# Altium schematic symbol library lib_datalogger.SchLib: 1246 symbols (part 3 of 16) (continued)
## CMP-003-00018-2 (continued)
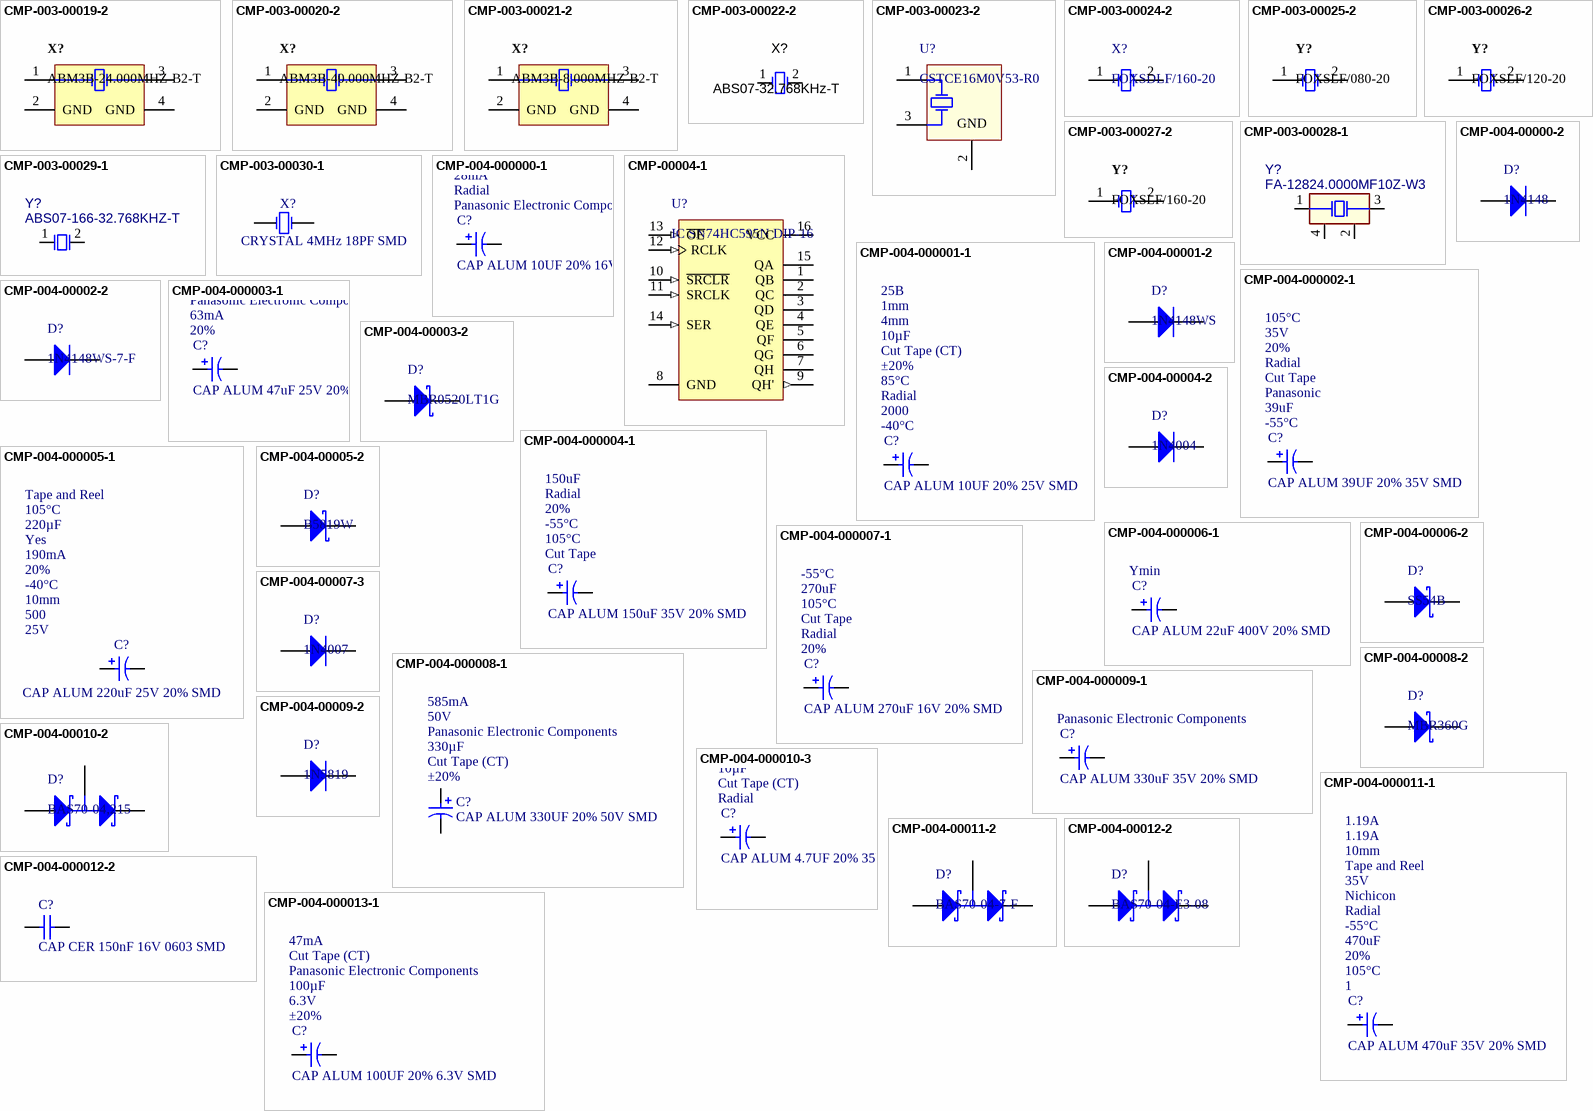
[diagram p7: symbols CMP-003-00019-2 to CMP-004-000013-1]

## CMP-003-00019-2
designator X?, comment ABM3B-24.000MHZ-B2-T
Ceramic SMD Crystal, 24 MHz, +/- 20 ppm, 18 pF, -20 to 70 degC, 4-Pin SMD, RoHS, Tape and Reel; Manufacturer: Abracon; Load Capacitance: 18pF; Frequency Tolerance: 20ppm; ESR: 50; Resistance: 50Ohm; Frequency: 24MHz; Package Quantity: 1000; Packaging: TapeandReel; RoHS Compliant: True; Package Description: 4-Pin Surface Mount Device, Body 5 x 3.2 mm; Mounting Technology: SM; Pins: 4; Datasheet URL: http://www.abracon.com/Resonators/abm3b.pdf; Tolerance: 20ppm; Manufacturer URL: http://www.abracon.com/; Max Operating Temperature: 70°C; Datasheet Version: Aug-15; Min Operating Temperature: -20°C; Package Reference: ABM3B; Case/Package: CSMD
footprint ABRA-ABM3B-4_V (SMD, 4-Leads, Body 5x3.2mm)
pins: 1 X1, 2 GND (power), 3 X2, 4 GND (power)

## CMP-003-00020-2
designator X?, comment ABM3B-40.000MHZ-B2-T
Ceramic SMD Crystal, 40 MHz, +/- 20 ppm, 18 pF, -20 to 70 degC, 4-Pin SMD, RoHS, Tape and Reel; Manufacturer: Abracon; Frequency: 40MHz; Tolerance: 20ppm; Load Capacitance: 18pF; ESR: 50; Case/Package: CSMD; RoHS Compliant: True; Package Quantity: 1000; Manufacturer URL: http://www.abracon.com/; Mounting Technology: SM; Min Operating Temperature: -20°C; Datasheet Version: Aug-15; Package Reference: ABM3B; Package Description: 4-Pin Surface Mount Device, Body 5 x 3.2 mm; Max Operating Temperature: 70°C; Packaging: TapeandReel; Frequency Tolerance: 20ppm; Datasheet URL: http://www.abracon.com/Resonators/abm3b.pdf
footprint ABRA-ABM3B-4_V (SMD, 4-Leads, Body 5x3.2mm)
pins: 1 X1, 2 GND (power), 3 X2, 4 GND (power)

## CMP-003-00021-2
designator X?, comment ABM3B-8.000MHZ-B2-T
Ceramic SMD Crystal, 8 MHz, +/- 20 ppm, 18 pF, -20 to 70 degC, 4-Pin SMD, RoHS, Tape and Reel; Manufacturer: Abracon; Resistance: 200Ohm; ESR: 200; Tolerance: 20ppm; Frequency: 8MHz; Load Capacitance: 18pF; Mounting Technology: SM; Case/Package: CSMD; Pins: 4; Datasheet Version: Aug-15; Datasheet URL: http://www.abracon.com/Resonators/abm3b.pdf; Manufacturer URL: http://www.abracon.com/; Package Quantity: 1000; Package Description: 4-Pin Surface Mount Device, Body 5 x 3.2 mm; Package Reference: ABM3B; Min Operating Temperature: -20°C; Max Operating Temperature: 70°C; Packaging: TapeandReel; Frequency Tolerance: 20ppm; RoHS Compliant: True
footprint ABRA-ABM3B_V (SMD, 4-Leads, Body 5x3.2mm)
pins: 1 X1, 2 GND (power), 3 X2, 4 GND (power)

## CMP-003-00022-2
designator X?, comment ABS07-32.768KHz-T
Low Profile Crystal, 32.768 kHz, +/- 20 ppm, 12.5 pF, -40 to 85 degC, 2-Pin SMD, Pb-Free, Tape and Reel; Manufacturer: Abracon; Frequency Tolerance: 20ppm; ESR: 70k; Load Capacitance: 12.5pF; Max Operating Temperature: 85°C; Mounting Technology: SM; Manufacturer URL: http://www.abracon.com/; Pins: 2; Packaging: TapeandReel; Tolerance: 20ppm; Min Operating Temperature: -40°C; Frequency: 32.768kHz; Datasheet URL: http://www.abracon.com/Resonators/ABS07.pdf; RoHS Compliant: True; Package Description: 2-Pin Surface Mount Device, Body 3.2 x 1.5 mm; Datasheet Version: Aug-15; Package Reference: ABS07-2; Package URL: http://www.abracon.com/Support/PackageDrawing/Resonators/ABS07.PDF; Package Quantity: 3000; Case/Package: CSMD
footprint ABRA-ABS07-2_V (SMD, 2-Leads, Body 3.2x1.5mm)
pins: 1 OSC1, 2 OSC2

## CMP-003-00023-2
designator U?, comment CSTCE16M0V53-R0
Ceramic Resonator, 16 MHz, +/- 0.5%, 15 pF, -20 to 80 degC, 3-Pin SMD, RoHS, Tape and Reel; Manufacturer: Murata; Frequency: 16MHz; Impedance: 40Ohm; Load Capacitance: 15pF; Min Operating Temperature: -20°C; Case/Package: CSMD; Frequency Tolerance: 0.5%; Max Operating Temperature: 80°C; Datasheet URL: http://www.murata.com/products/catalog/pdf/p16e.pdf; Manufacturer URL: http://www.murata.com/; Self Resonant Frequency: 16MHz; Tolerance: 0.5%; Package Reference: CSTCE_V-3; Package Quantity: 3000; Packaging: TapeandReel; Pins: 3; Datasheet Version: Rev. P16E, 12/2015; RoHS Compliant: True
footprint MURA-CSTCE_V-3_V (SMD, 3-Leads, Body 3.2x1.3mm, Pitch 0.95mm)
pins: 1 C1, 2 GND (power), 3 C2

## CMP-003-00024-2
designator X?, comment FOXSDLF/160-20
Resistance Weld SMD Crystal, 16 MHz, +/- 30 ppm, 20 pF, -20 to 70 degC, 2-Pin SMD, RoHS, Tape and Reel; Manufacturer: FOX Electronics; Load Capacitance: 20pF; Frequency Tolerance: 30ppm; Tolerance: 50ppm; Resistance: 40Ohm; Frequency: 16MHz; ESR: 40; Packaging: TapeandReel; Mounting Technology: SM; Package Description: 2-Pin Surface Mount Device, Body 5 x 11.7 mm, Height 4.5 mm; Pins: 2; Datasheet URL: http://foxonline.com/pdfs/hc49sdlf.pdf; Max Operating Temperature: 70°C; Package Reference: FOX-FOXSDLF160-20; Datasheet Version: Mar-15; Package Quantity: 1; Manufacturer URL: http://www.foxonline.com/; Case/Package: FOX-FOXSDLF160-20; Min Operating Temperature: -20°C; RoHS Compliant: True
footprint FOX-FOXSDLF160-20_V (SMD, 2-Leads, Body 5x11.7mm, Height 4.5mm)
pins: 1 X1, 2 X2

## CMP-003-00025-2
designator Y?, comment FOXSLF/080-20
Resistance Weld Thru-Hole Crystal, 8 MHz, +/- 50 ppm, 10 pF, -20 to 70 degC, 2-Pin THD, RoHS, Bulk; Manufacturer: FOX Electronics; Load Capacitance: 20pF; Frequency Tolerance: 30ppm; Tolerance: 50ppm; ESR: 80; Resistance: 80Ohm; Frequency: 8MHz; Packaging: Bulk; Datasheet Version: Mar-15; Manufacturer URL: http://www.foxonline.com/; Package Reference: FOXSLF080-20; Max Operating Temperature: 70°C; Package Quantity: 100; RoHS Compliant: True; Pins: 2; Mounting Technology: TH; Package Description: 2-Pin Through Hole Device, Body 11.35 x 4.65 mm; Datasheet URL: http://download.siliconexpert.com/pdfs/2015/4/5/6/5/7/200/fox_/manual/35607121449963728hc49slf.pdf; Min Operating Temperature: -20°C; Case/Package: FOXSLF080-20
footprint FOX-FOXSLF080-20 (THD, 2-Leads, Body 11.35x4.65mm)
pins: 1, 2

## CMP-003-00026-2
designator Y?, comment FOXSLF/120-20
Resistance Weld Thru-Hole Crystal, 12 MHz, +/-30 ppm, 20 pF, -20 to 70 degC, 2-Pin THD, RoHS, Bulk; Manufacturer: FOX Electronics; ESR: 60; Resistance: 60Ohm; Frequency Tolerance: 30ppm; Load Capacitance: 20pF; Frequency: 12MHz; Tolerance: 50ppm; Max Operating Temperature: 70°C; Case/Package: FOXSLF-2; Datasheet Version: Mar-15; Mounting Technology: TH; Package Quantity: 100; Package Description: 2-Pin Through Hole Device, Body 11.35 x 4.65 mm, Pitch 4.88 mm; Packaging: Bulk; Package Reference: FOXSLF-2; RoHS Compliant: True; Pins: 2; Datasheet URL: http://www.foxonline.com/pdfs/hc49slf.pdf; Manufacturer URL: http://www.foxonline.com/; Min Operating Temperature: -20°C
footprint FOX-FOXSLF-2_V (THD, 2-Leads, Body 11.35x4.65mm, Pitch 4.88mm)
pins: 1, 2

## CMP-003-00027-2
designator Y?, comment FOXSLF/160-20
Resistance Weld Thru-Hole Crystal, 16 MHz, +/- 30 ppm, 20 pF, -20 to 70 degC, 2-Pin THD, RoHS, Bulk; Manufacturer: FOX Electronics; Load Capacitance: 20pF; Resistance: 40Ohm; ESR: 40; Tolerance: 50ppm; Frequency Tolerance: 30ppm; Frequency: 16MHz; Datasheet URL: http://www.foxonline.com/pdfs/hc49slf.pdf; Packaging: Bulk; Min Operating Temperature: -20°C; Max Operating Temperature: 70°C; Mounting Technology: TH; RoHS Compliant: True; Datasheet Version: Mar-15; Manufacturer URL: http://www.foxonline.com/; Package Description: 2-Pin Through Hole Device, Body 11.35 x 4.65 mm; Pins: 2; Package Quantity: 100; Case/Package: FOXSLF160-20; Package Reference: FOXSLF160-20
footprint FOX-FOXSLF160-20 (THD, 2-Leads, Body 11.35x4.65mm)
pins: 1, 2

## CMP-003-00028-1
designator Y?, comment FA-12824.0000MF10Z-W3
Crystal, 24 MHz, +/- 10 ppm, -20 to 75 degC, 4-Pin SMD, RoHS, Tape and Reel; Load Capacitance: 12pF; Frequency: 24MHz; ESR: 80; Mounting Technology: SMT; Pins: 4; Case/Package: SMD/SMT; Min Operating Temperature: -20°C; RoHS Compliant: Yes; Max Operating Temperature: 75°C
footprint EPSON-FA-128_V (SMD, 4-Leads, Body 2x1.6mm, Pitch 1.45mm)
footprint EPSON-FA-128_V (SMD, 4-Leads, Body 2x1.6mm, Pitch 1.45mm)
pins: 1 X1, 2 NC (power), 3 X2, 4 NC (power)

## CMP-003-00029-1
designator Y?, comment ABS07-166-32.768KHZ-T
Crystal 32.768kHz 10ppm 7pF -40C +85C; Pins: 2; Frequency: 32.768kHz
footprint EPSON-FC-135_V (SMD, 2-Leads, Body 3.2x1.5mm)
footprint EPSON-FC-135_V-9 (SMD, 2-Leads, Body 3.2x1.5mm)
pins: 1, 2

## CMP-003-00030-1
designator X?, comment CRYSTAL 4MHz 18PF SMD
Crystal 4MHz ±20ppm (Tol) ±50ppm (Stability) 18pF FUND 180Ohm 2-Pin HC-49/US SMD T/R; Manufacturer Part Number: ABLS-4.000MHZ-B2-T; Series Resistance: 180R; Max Operating Temperature: 70°C; Height: 0.165inch; Frequency Tolerance: 20ppm; Termination: SMD/SMT; Lead Free: Lead Free; Series: ABLS; Number of Pins: 2; Width: 0.185inch; Depth: 4.7mm; Tolerance: 20ppm; Package Quantity: 1000; Radiation Hardening: No; Load Capacitance: 18pF; ESR (Equivalent Series Resistance): 180R; Operating Frequency: 4 MHz; Min Operating Temperature: -20°C; Frequency: 4MHz; Case/Package: SMD/SMT; Mount: Surface Mount; REACH SVHC: Yes; Packaging: Tape and Reel; Frequency Stability: 50ppm; Length: 11.4mm
footprint 2-SMD 3215
footprint Crystal HP59US
pins: 1, 2

## CMP-004-000000-1
designator C?, comment CAP ALUM 10UF 20% 16V SMD  Manufacturer: Panasonic Electronic Components  Case/Package: Radial  Ripple Current: 28mA  Capacitance: 10µF  Packaging: Cut Tape (CT)  Package Quantity: 1  Max Operating Temperature: 105°C  Tolerance: ±20%  Lead Pitch: 1mm  Min Operating Temperature: -40°C  Diameter: 4mm  RoHS Compliant: Yes  Voltage Rating: 16V
Aluminum Electrolytic Capacitors - SMD 10uF 16V; Manufacturer Part Number: EEE-HB1C100R; Lead Diameter: 0.65mm; Surface Mount Land Size: 0.169" L x 0.169" W (4.30mm x 4.30mm); Life (Hours): 1000Hour; Lifetime @ Temp.: 2000 Hrs @ 105°C; Polarization: Polar; Leakage Current: 3uA; Height - Seated (Max): 0.228" (5.80mm); Category: Capacitors; Lead Spacing: -; ComponentLink9Description: https://datasheet.ciiva.com/46386/1446029-46386252.pdf?src-supplier=Element14; ComponentLink10Description: https://datasheet.ciiva.com/14604/70256712-14604238.pdf?src-supplier=Allied+Electronics; Package / Case: Radial, Can - SMD; RoHS: RoHS Compliant; Voltage Rating (DC): 16V; Stock 1: 25234; Pricing 1: 1=0.31, 10=0.21, 25=0.1684, 50=0.1402, 100=0.1192, 250=0.09468, 500=0.08414, 1000=0.07363 (USD); ComponentLink1URL: https://industrial.panasonic.com/cdbs/www-data/pdf/RDE0000/ABA0000C1157.pdf; ComponentLink5Description: https://datasheet.ciiva.com/2985/aba0000ce3-2985640.pdf?src-supplier=Avnet; ComponentLink12URL: https://datasheet.ciiva.com/24071/aba0000ce3-259063-24071183.pdf?src-supplier=Mouser; ComponentLink7URL: https://datasheet.ciiva.com/46376/1446029-46376825.pdf?src-supplier=Element14; Height: 5.4mm; Part Status: Active; Operating Temperature: -40°C ~ 105°C; Series: HA; ComponentLink4URL: https://datasheet.ciiva.com/43459/1446029-43459815.pdf?src-supplier=Farnell; Lead Free: Lead Free; ComponentLink9URL: https://datasheet.ciiva.com/46386/1446029-46386252.pdf?src-supplier=Element14; Source: mits.SchLib; Length: 5.5mm; Size / Dimension: 0.157" Dia (4.00mm); Radiation Hardening: No; ComponentLink11URL: https://datasheet.ciiva.com/30262/33aba0000ce3-30262478.pdf?src-supplier=Onlinecomponents.com; ComponentLink8Description: https://datasheet.ciiva.com/16539/aba0000ce3-16539836.pdf?src-supplier=Avnet+Asia; ComponentLink4Description: https://datasheet.ciiva.com/43459/1446029-43459815.pdf?src-supplier=Farnell; ComponentLink6URL: https://datasheet.ciiva.com/14593/70256712-14593785.pdf?src-supplier=Allied+Electronics; Ripple Current (AC): 28mA; ComponentLink5URL: https://datasheet.ciiva.com/2985/aba0000ce3-2985640.pdf?src-supplier=Avnet; Applications: Automotive; ComponentLink8URL: https://datasheet.ciiva.com/16539/aba0000ce3-16539836.pdf?src-supplier=Avnet+Asia; Voltage: 16V; Width: 650um; ComponentLink3URL: https://datasheet.ciiva.com/2983/aba0000ce3-2983985.pdf?src-supplier=Avnet; ComponentLink2URL: https://datasheet.ciiva.com/11777/0900766b8102e3f9-11777432.pdf?src-supplier=RSComponents; Mounting Type: Surface Mount; Termination: SMD/SMT; ESR (Equivalent Series Resistance): -; ComponentLink12Description: https://datasheet.ciiva.com/24071/aba0000ce3-259063-24071183.pdf?src-supplier=Mouser; Contact Plating: Tin; REACH SVHC: No SVHC; ComponentLink7Description: https://datasheet.ciiva.com/46376/1446029-46376825.pdf?src-supplier=Element14; ComponentLink6Description: https://datasheet.ciiva.com/14593/70256712-14593785.pdf?src-supplier=Allied+Electronics; Design Item ID: CAP ALUM 10UF 20% 16V SMD; ComponentLink3Description: https://datasheet.ciiva.com/2983/aba0000ce3-2983985.pdf?src-supplier=Avnet; ComponentLink11Description: https://datasheet.ciiva.com/30262/33aba0000ce3-30262478.pdf?src-supplier=Onlinecomponents.com; Mount: Surface Mount,PCB; Construction: Cylindrical; Stock 2: 15465; ComponentLink1Description: https://industrial.panasonic.com/cdbs/www-data/pdf/RDE0000/ABA0000C1157.pdf; ComponentLink2Description: https://datasheet.ciiva.com/11777/0900766b8102e3f9-11777432.pdf?src-supplier=RSComponents; Impedance: -; ComponentLink10URL: https://datasheet.ciiva.com/14604/70256712-14604238.pdf?src-supplier=Allied+Electronics; Pricing 2: 5=0,11620, 50=0,09150, 150=0,08690, 500=0,08230, 2500=0,08030, 5000=0,07930, 5=0,11200, 50=0,08820, 150=0,08370, 500=0,07930, 2500=0,07740, 5000=0,07640, 5=0,58090, 50=0,45730, 150=0,43440, 500=0,41150, 2500=0,40160, 5000=0,39640, 5=0,55990, 50=0,44080, 150=0,41870, 500=0,39660, 2500=0,38720, 5000=0,38210, 5=0,07510, 50=0,05910, 150=0,05620, 500=0,05320, 2500=0,05190, 5000=0,05120, 5=0,06440, 50=0,05070, 150=0,04810, 500=0,04560, 2500=0,04450, 5000=0,04390, 5=0,68990, 50=0,54310, 150=0,51590, 500=0,48870, 2500=0,47700, 5000=0,47080, 5=9,73370, 50=7,66200, 150=7,27840, 500=6,89470, 2500=6,73030, 5000=6,64260, 5=0,36820, 50=0,28980, 150=0,27530, 500=0,26080, 2500=0,25460, 5000=0,25130, 5=6,75000, 50=5,31340, 150=5,04730, 500=4,78130, 2500=4,66720, 5000=4,60640, 5=0,76730, 50=0,60400, 150=0,57370, 500=0,54350, 2500=0,53050, 5000=0,52360, 5=0,11950, 50=0,09410, 150=0,08940, 500=0,08470, 2500=0,08260, 5000=0,08160, 5=0,08880, 50=0,06990, 150=0,06640, 500=0,06290, 2500=0,06140, 5000=0,06060 (AUD)
footprint CAP_SMD_D5_H6
footprint CAP_SMD_D4
pins: 1, 2
1 alternate drawing of the same symbol

## CMP-004-00000-2
designator D?, comment 1N4148
High Speed Diode, 100 V, 0.45 A, -65 to 175 degC, 2-Pin SOD27, RoHS, Bulk; Manufacturer: Fairchild; Elements: 1; Recovery Time: 4ns; Forward Current: 300mA; Power: 500mW; Forward Voltage: 1V; Max Surge Current: 4A; Peak Reverse Current: 5uA; Datasheet URL: http://www.nxp.com/documents/data_sheet/1N4148_1N4448.pdf; Min Operating Temperature: -65°C; Manufacturer URL: https://www.fairchildsemi.com/; Packaging: Bulk; Diameter: 1.91mm; Pins: 2; Package URL: http://www.nxp.com/documents/data_sheet/1N4148_1N4448.pdf; Package Reference: SOD27; Max Operating Temperature: 175°C; Package Quantity: 2000; Case/Package: DO; Datasheet Version: Aug-04; RoHS Compliant: True
footprint NXP-SOD27-2_V (SOD27, 2-Leads, Dia 1.85mm, Body Length 4.25mm, Pin Spacing 9mm)
pins: 1 A, 2 K

## CMP-00004-1
designator U?, comment IC SN74HC595N DIP-16
IC 74HC595N 8-Bit Shift Register DIP-16; Quiescent Current: 8uA; Number of Elements: 1; Turn-On Delay Time: 250ns; Max Supply Voltage: 6V; Number of Output Lines: 10; Number of Bits per Element: 8; Min Supply Voltage: 2V; Operating Supply Voltage: 5V; Number of Circuits: 4; Direction: Unidirectional; Package Quantity: 25; Height: 4.57mm; REACH SVHC: No SVHC; Radiation Hardening: No; Weight: 0.03357oz; Lead Free: Lead Free; Logic Function: Shift Register; Contact Plating: Gold; Propagation Delay: 250ns; Max Operating Temperature: 85°C; Mount: Through Hole; Width: 6.35mm; RoHS Compliant: Yes; Min Operating Temperature: -40°C; Case/Package: PDIP; Length: 19.3mm; Packaging: Rail/Tube; Number of Bits: 8; Number of Pins: 16
footprint N0016A (DIP, 16-Leads, Body 19.7x6.6mm, Pitch 2.54mm)
pins: 1 QB (hiz), 2 QC (hiz), 3 QD (hiz), 4 QE (hiz), 5 QF (hiz), 6 QG (hiz), 7 QH (hiz), 8 GND (power), 9 QH' (out), 10 ~{SRCLR} (in), 11 SRCLK (in), 12 RCLK (in), 13 ~{OE} (in), 14 SER (in), 15 QA (hiz), 16 VCC (power)

## CMP-004-000001-1
designator C?, comment CAP ALUM 10UF 20% 25V SMD  Min Operating Temperature: -40°C  Package Quantity: 2000  Case/Package: Radial  Max Operating Temperature: 85°C  Tolerance: ±20%  Packaging: Cut Tape (CT)  Capacitance: 10µF  Diameter: 4mm  Lead Pitch: 1mm  Voltage Rating: 25B
Manufacturer 1: Lelon; Manufacturer Part Number 1: VE-100M1ETR-0405; Dissipation Factor: 0.12%; Lifetime @ Temp.: 2000 Hrs @ 105°C; Surface Mount Land Size: 0.169" L x 0.169" W (4.30mm x 4.30mm); Dielectric Material: Aluminium; Life (Hours): 2000Hour; Voltage: 35V; Voltage Rating (DC): 25; Polarization: Polar; Lead Diameter: 0.8mm; Length: 5.4mm; Mounting Type: Surface Mount; Number of Pins: 2; RoHS: RoHS Compliant; Operating Temperature: -40°C ~ 105°C; Termination: SMD/SMT; Width: 0.25inch; Part Status: Active; Design Item ID: CAP ALUM 10UF 20% 25V SMD; Package / Case: Radial, Can - SMD; Applications: Automotive; Source: mits.SchLib; ESR (Equivalent Series Resistance): -; Height: 5.4mm; Height - Seated (Max): 0.228" (5.80mm); Size / Dimension: 0.157" Dia (4.00mm); Category: Capacitors
footprint CAP_SMD_D5_H6
footprint CAP_SMD_D4
pins: 1, 2
1 alternate drawing of the same symbol

## CMP-004-00001-2
designator D?, comment 1N4148WS
Small Signal Diode, 75 V, 0.15 A, -55 to 150 degC, 2-Pin SOD-323, RoHS, Tape and Reel; Manufacturer: Fairchild; Recovery Time: 4ns; Forward Voltage: 1V; Peak Reverse Current: 5uA; Forward Current: 150mA; Capacitance: -323f; Datasheet URL: https://www.fairchildsemi.com/datasheets/1N/1N4148WS.pdf; Package Reference: SOD-323; Package Description: 2-Pin Small Outline Diode Flat Lead, Body 1.7 x 1.25 mm; Case/Package: SOD-323; Mounting Technology: SM; Manufacturer URL: https://www.fairchildsemi.com/; Pins: 2; Packaging: TapeandReel; Package Quantity: 3000; Min Operating Temperature: -55°C; RoHS Compliant: True; Max Operating Temperature: 150°C; Datasheet Version: Rev. 1.2, 03/2015
footprint FAIR-SOD-323_V (SODFL, 2-Leads, Body 1.25x1.7mm)
pins: 1 A, 2 K

## CMP-004-000002-1
designator C?, comment CAP ALUM 39UF 20% 35V SMD  Min Operating Temperature: -55°C  Capacitance: 39uF  Manufacturer: Panasonic  Packaging: Cut Tape  Case/Package: Radial  Tolerance: 20%  Voltage Rating: 35V  Max Operating Temperature: 105°C
SMD AL ELECTROLYTIC, 35VDC, 39UF; Manufacturer Part Number: EEE-FK1V390SR; Life (Hours): 2000Hour; ESR (Equivalent Series Resistance): 700mR; Polarity: Polar; ComponentLink2URL: https://industrial.panasonic.com/cdbs/www-data/pdf/RDE0000/ABA0000C1251.pdf?src-supplier=Digi-Key; Source: mits.SchLib; Mount: Surface Mount; Stock 1: 10902; Pricing 1: 1=0,45000, 10=0,31800, 100=0,20960, 500=0,15526 (USD); Design Item ID: CAP ALUM 39UF 20% 35V SMD; ComponentLink1URL: https://industrial.panasonic.com/cdbs/www-data/pdf/RDE0000/ABA0000C1157.pdf; ComponentLink1Description: https://industrial.panasonic.com/cdbs/www-data/pdf/RDE0000/ABA0000C1157.pdf; Ratings: AEC-Q200; ComponentLink2Description: https://industrial.panasonic.com/cdbs/www-data/pdf/RDE0000/ABA0000C1251.pdf?src-supplier=Digi-Key; RoHS: No
footprint CAP_SMD_D5_H6
footprint CAP_SMD_D5_H6
pins: 1, 2
1 alternate drawing of the same symbol

## CMP-004-00002-2
designator D?, comment 1N4148WS-7-F
Fast Switching Diode, 75 V, 0.3 A, -65 to 150 degC, 2-Pin SOD323, RoHS, Tape and Reel; Manufacturer: Diodes Inc; Peak Reverse Current: 1uA; Max Surge Current: 2A; Elements: 1; Forward Current: 300mA; Recovery Time: 4ns; Forward Voltage: 1.25V; Datasheet Version: Rev. 25-2, 03/2016; Case/Package: SOD; Min Operating Temperature: -65°C; RoHS Compliant: True; Max Operating Temperature: 150°C; Manufacturer URL: http://www.diodes.com/; Pins: 2; Package Quantity: 3000; Datasheet URL: http://www.diodes.com/datasheets/ds30097.pdf; Packaging: TapeandReel; Package Description: 2-Pin Small Outline Diode, Body 1.7 x 1.3 mm; Mounting Technology: SM; Package Reference: SOD323-2
footprint DIOD-SOD323-2-A_V (SOD-323, 2-Leads, Body 1.7x1.3mm, Lead Span 2.5mm)
pins: 1 A, 2 K

## CMP-004-000003-1
designator C?, comment CAP ALUM 47uF 25V 20% SMD  Tolerance: 20%  Ripple Current: 63mA  Manufacturer: Panasonic Electronic Components  Packaging: Tape and Reel  Voltage Rating: 35V  Min Operating Temperature: -55°C  Lead Pitch: 2.2mm  Max Operating Temperature: 105°C  Case/Package: Radial  Package Quantity: 1000  Diameter: 6.3mm  Capacitance: 47uF
Cap Aluminum 47uF 35V 20% (6.3 X 5.8mm) SMD 63mA 1000 hr 105C T/R; Manufacturer Part Number: UWT1V470MCL1GS; Part#: EEE-FK1E470P; Lead Diameter: 0.8mm; MSRP: 0,2103; eVendor: Digi-Key; eVendorPrice: 0,56; Dissipation Factor: 0.14%; Life (Hours): 1000Hour; eVendor#: PCE3804CT-ND; Dielectric Material: Aluminium; Leakage Current: 3uA; ComponentLink1Description: https://datasheet.ciiva.com/11778/0900766b80fa3a91-11778012.pdf?src-supplier=RSComponents; REACH SVHC: No SVHC; Mount: Surface Mount; Contact Plating: Tin; ComponentLink2URL: https://datasheet.ciiva.com/96/e-wt-96490.pdf?src-supplier=Digi-Key; ComponentLink5Description: https://datasheet.ciiva.com/96/e-wt-96492.pdf?src-supplier=Digi-Key; Voltage: 35V; ComponentLink7Description: https://datasheet.ciiva.com/17354/e-wt-17354863.pdf?src-supplier=Avnet+Europe; Stock 1: 128274; Height: 5.8mm; ComponentLink3URL: https://datasheet.ciiva.com/7793/e-wt-7793514.pdf?src-supplier=Element14; Radiation Hardening: No; Datasheet: http://industrial.panasonic.com/www-cgi/jvcr13pz.cgi?E+PZ+3+ABA0120+EEEFK1E470P+7+WW; ComponentLink5URL: https://datasheet.ciiva.com/96/e-wt-96492.pdf?src-supplier=Digi-Key; Ripple Current (AC): 63mA; ComponentLink4Description: https://datasheet.ciiva.com/96/e-wt-96491.pdf?src-supplier=Digi-Key; Voltage Rating (DC): 35V; Category: Aluminum Electrolytic Capacitors; ComponentLink7URL: https://datasheet.ciiva.com/17354/e-wt-17354863.pdf?src-supplier=Avnet+Europe; Design Item ID: CAP ALUM 47uF 25V 20% SMD; ComponentLink6Description: https://datasheet.ciiva.com/16512/e-wt-16512654.pdf?src-supplier=Future+Electronics; ComponentLink3Description: https://datasheet.ciiva.com/7793/e-wt-7793514.pdf?src-supplier=Element14; Number of Pins: 2; ComponentLink4URL: https://datasheet.ciiva.com/96/e-wt-96491.pdf?src-supplier=Digi-Key; ComponentLink6URL: https://datasheet.ciiva.com/16512/e-wt-16512654.pdf?src-supplier=Future+Electronics; Length: 5.8mm; Source: mits.SchLib; Pricing 1: 1=0,38000, 10=0,26600, 100=0,15970, 500=0,11974 (USD); Termination: SMD/SMT; Height - Seated (Max): 0.228inch; ComponentLink2Description: https://datasheet.ciiva.com/96/e-wt-96490.pdf?src-supplier=Digi-Key; ComponentLink1URL: https://datasheet.ciiva.com/11778/0900766b80fa3a91-11778012.pdf?src-supplier=RSComponents; Lead Free: Lead Free; MOQ: 500; RoHS: Yes
footprint CAP_SMD_D5_H6
footprint CAP_SMD_D63_P22_H58
pins: 1, 2
1 alternate drawing of the same symbol

## CMP-004-00003-2
designator D?, comment MBR0520LT1G
Schottky Power Rectifier, 20 V, 5.5 A, -65 to 125 degC, 2-Pin SMD, RoHS, Tape and Reel; Manufacturer: ON Semiconductor; Forward Current: 500mA; Peak Reverse Current: 250uA; Elements: 1; Forward Voltage: 385mV; Max Surge Current: 5.5A; Max Operating Temperature: 125°C; Min Operating Temperature: -65°C; Mounting Technology: SM; Datasheet URL: http://www.onsemi.cn/pub_link/Collateral/MBR0520LT1-D.PDF; RoHS Compliant: True; Pins: 2; Package Quantity: 3000; Case/Package: SOD; Package Reference: SOD-123-2-425-04; Package Description: 2-Pin Surface Mount Device, Body 2.69 x 1.6 mm; Packaging: TapeandReel; Manufacturer URL: http://www.onsemi.com/; Datasheet Version: Rev. 6, 01/2012
footprint ONSC-SOD-123-2-425-04_V (SOD, 2-Leads, Body 2.69x1.6mm)
pins: 1 A, 2 K

## CMP-004-000004-1
designator C?, comment CAP ALUM 150uF 35V 20% SMD  Packaging: Cut Tape  Max Operating Temperature: 105°C  Min Operating Temperature: -55°C  Tolerance: 20%  Case/Package: Radial  Capacitance: 150uF
ALUMINUM ELECTROLYTIC CAPACITORS - SMD 150UF ±20% 35V SMD,6.3X7.7MM ROHS; Manufacturer Part Number 1: VZT151M1VTR-0607; Manufacturer 1: Lelon; Dielectric Material: Aluminium; Voltage: 35V; Category: Aluminum Electrolytic Capacitors; Source: mits.SchLib; ComponentLink1Description: https://datasheet.lcsc.com/szlcsc/Lelon-OVZ271M1CTR-0807_C164072.pdf; Contact Plating: Tin; Mount: Surface Mount; ComponentLink1URL: https://datasheet.lcsc.com/szlcsc/Lelon-OVZ271M1CTR-0807_C164072.pdf; RoHS: Yes; Number of Pins: 2; Voltage Rating (DC): 35V; Design Item ID: CAP ALUM 150uF 35V 20% SMD; Termination: SMD/SMT
footprint CAP_SMD_D5_H6
footprint CAP_SMD_D8_H6.7
pins: 1, 2
1 alternate drawing of the same symbol

## CMP-004-00004-2
designator D?, comment 1N4004
General Purpose Rectifier, 400 V, 1 A, -55 to 175 degC, 2-Pin DO-204AL (DO-41), RoHS, Tape and Reel; Manufacturer: Fairchild Semiconductor; Forward Voltage: 1.1V; Forward Current: 1A; Max Surge Current: 30A; Package Version: Rev. 2, 09/2008; Peak Reverse Current: 50A; Case/Package: DO-41-2; Pins: 2; RoHS Compliant: True; Diameter: 2.72mm; Package Reference: DO-41-2; Datasheet URL: https://www.fairchildsemi.com/datasheets/1N/1N4004.pdf; Manufacturer URL: https://www.fairchildsemi.com/; Max Operating Temperature: 175°C; Datasheet Version: Rev. 1.1.0, 11/2014; Package URL: http://www.fairchildsemi.com/dwg/DO/DO41A.pdf; Package Quantity: 5000; Min Operating Temperature: -55°C; Package Description: 2-Pin Axial Lead, Dia 2.375 mm, Body Length 4.63 mm; Mounting Technology: TH; Packaging: TapeandReel
footprint FAIR-DO-41-2 (THD, 2-Leads, Body 5.2x2.72mm, Pin Spacing 7.8mm)
pins: 1 A, 2 K

## CMP-004-000005-1
designator C?, comment CAP ALUM 220uF 25V 20% SMD  Voltage Rating: 25V  Package Quantity: 500  Diameter: 10mm  Min Operating Temperature: -40°C  Tolerance: 20%  Ripple Current: 190mA  RoHS Compliant: Yes  Capacitance: 220µF  Max Operating Temperature: 105°C  Packaging: Tape and Reel
CAP ALUM 220UF 20% 25V SMD; Manufacturer 1: Panasonic; Manufacturer Part Number 1: EEE-HA1E221AP; Polarity: Polar; Impedance: 170 mOhm; Lifetime @ Temp.: 5000 Hrs @ 105°C; Life (Hours): 1000Hour; Surface Mount Land Size: 0.327" L x 0.327" W (8.30mm x 8.30mm); Package / Case: Radial, Can - SMD; RoHS: RoHS Compliant; Operating Temperature: -55°C ~ 105°C; ComponentLink1URL: http://nichicon-us.com/english/products/pdfs/e-uud.pdf; Height - Seated (Max): 0.402inch; Mounting Type: Surface Mount; Source: mits.SchLib; Stock 1: 22695; ESR (Equivalent Series Resistance): -; Voltage Rating (DC): 25V; Construction: Cylindrical; Series: HA; Design Item ID: CAP ALUM 220uF 25V 20% SMD; Pricing 1: 1=0.68, 10=0.648, 25=0.4592, 50=0.3868, 100=0.3143, 250=0.26108 (USD); Lead Spacing: -; ComponentLink1Description: http://nichicon-us.com/english/products/pdfs/e-uud.pdf; Mount: Surface Mount; Radiation Hardening: No; Termination: SMD/SMT; Applications: General Purpose; Polarization: -; Length: 10.5mm; Height: 10.2mm; Category: Aluminum Electrolytic Capacitors; Size / Dimension: 0.315" Dia (8.00mm)
footprint CAP_SMD_D80_P31_H100
footprint CAP_SMD_D80_P31_H100
pins: 1, 2

## CMP-004-00005-2
designator D?, comment B5819W
Schottky Barrier Rectifier, 40 V, 1 A, -65 to 125 degC, 2-Pin SOD123, RoHS, Tape and Reel; Manufacturer: Micro Commercial Components; Datasheet Version: Rev. B, 01/2013; RoHS Compliant: Unknown; Manufacturer URL: http://www.mccsemi.com/; Package URL: http://www.mccsemi.com/up_pdf/1N4448W(SOD-123).pdf; Case/Package: SOD123; Mounting Technology: SM; Datasheet URL: http://www.mccsemi.com/up_pdf/B5817W-B5819W(SOD-123).pdf; Package Description: 2-Pin Small Outline Diode, Body 2.7 x 1.6 mm, Height 1.35 mm; Package Reference: SOD123
footprint MCC-SOD123_V (SOD123, 2-Leads, Body 2.7x1.6mm, Height 1.35mm)
pins: 1 A, 2 K

## CMP-004-000006-1
designator C?, comment CAP ALUM 22uF 400V 20% SMD  Manufacturer: Ymin
Cap Aluminum 22uF ±20% 400V (10 X 10.3mm) SMD; Manufacturer Part Number: VKME2102G220MV; ComponentLink1Description: https://datasheet.lcsc.com/szlcsc/2002201641_Ymin-VKME2102G220MV_C487573.pdf; Pricing 1: 1=0,48840, 10=0,37610, 30=0,35550, 100=0,33490, 500=0,32580, 1000=0,32110, 1=0,47190, 10=0,36340, 30=0,34350, 100=0,32350, 500=0,31470, 1000=0,31030, 1=2,46830, 10=1,90070, 30=1,79690, 100=1,69240, 500=1,64640, 1000=1,62300, 1=2,34350, 10=1,80460, 30=1,70600, 100=1,60690, 500=1,56320, 1000=1,54100, 1=0,31520, 10=0,24270, 30=0,22940, 100=0,21610, 500=0,21020, 1000=0,20720, 1=0,27400, 10=0,21100, 30=0,19940, 100=0,18790, 500=0,18270, 1000=0,18010, 1=2,95320, 10=2,27410, 30=2,14990, 100=2,02500, 500=1,96990, 1000=1,94190, 1=41,20240, 10=31,72750, 30=29,99490, 100=28,25160, 500=27,48270, 1000=27,09290, 1=1,55970, 10=1,20100, 30=1,13540, 100=1,06940, 500=1,04030, 1000=1,02560, 1=28,53080, 10=21,96990, 30=20,77020, 100=19,56290, 500=19,03060, 1000=18,76060, 1=3,19120, 10=2,45740, 30=2,32320, 100=2,18810, 500=2,12860, 1000=2,09840, 1=0,50470, 10=0,38870, 30=0,36750, 100=0,34610, 500=0,33670, 1000=0,33190, 1=0,38050, 10=0,29300, 30=0,27700, 100=0,26090, 500=0,25380, 1000=0,25020 (AUD); Design Item ID: CAP ALUM 22uF 400V 20% SMD; Category: Uncategorized; Stock 1: 130; RoHS: No; Source: mits.SchLib; ComponentLink1URL: https://datasheet.lcsc.com/szlcsc/2002201641_Ymin-VKME2102G220MV_C487573.pdf
footprint CAP_SMD_D5_H6
footprint CAP_SMD_D10
pins: 1, 2
1 alternate drawing of the same symbol

## CMP-004-00006-2
designator D?, comment SS54B
Schottky Barrier Rectifier, 40 V, 5 A, -55 to 150 degC, 2-Pin SMD; Manufacturer: JCET; Datasheet URL: http://wiki.seeedstudio.com/images/3/3f/0310130P1.pdf; Datasheet Version: May-13; Package Reference: SMB-2; RoHS Compliant: Unknown; Manufacturer URL: http://www.cj-elec.com/; Mounting Technology: SM; Package Description: 2-Pin Surface Mount Device, Body 4.315 x 3.62 mm; Case/Package: SMB-2
footprint JCET-SMB-2_N (Molded Diode, 2-Leads, Body 4.57x3.94mm)
footprint JCET-SMB-2_M (Molded Diode, 2-Leads, Body 4.57x3.94mm)
footprint JCET-SMB-2_L (Molded Diode, 2-Leads, Body 4.57x3.94mm)
pins: 1 A, 2 K

## CMP-004-000007-1
designator C?, comment CAP ALUM 270uF 16V 20% SMD  Tolerance: 20%  Case/Package: Radial  Packaging: Cut Tape  Max Operating Temperature: 105°C  Capacitance: 270uF  Min Operating Temperature: -55°C
270uF ±20% 16V 2000hrs 105℃ -55℃~+105℃ SMD,8x6.7mm Solid Polymer Electrolytic Capacitor RoHS; Part#: OVZ271M1CTR-0807; Manufacturer 1: Lelon; Dielectric Material: Aluminium; eVendor: LCSC; eVendorPrice: 0,12; ComponentLink1Description: https://datasheet.lcsc.com/szlcsc/Lelon-OVZ271M1CTR-0807_C164072.pdf; RoHS: Yes; Design Item ID: CAP ALUM 270uF 16V 20% SMD; Voltage Rating (DC): 16V; Number of Pins: 2; Termination: SMD/SMT; Source: mits.SchLib; Mount: Surface Mount; Manufacturer Part Number 1: OVZ271M1CTR-0807; Voltage: 16V; ComponentLink1URL: https://datasheet.lcsc.com/szlcsc/Lelon-OVZ271M1CTR-0807_C164072.pdf; Contact Plating: Tin; Category: Aluminum Electrolytic Capacitors
footprint CAP_SMD_D5_H6
footprint CAP_SMD_D8_H6.7
pins: 1, 2
1 alternate drawing of the same symbol
